# Altium footprint library FootprintsOld.PcbLib: 93 footprints (part 6 of 6)
Each footprint in its own frame and in the unit in brackets; x right, y up, seen from the top. Pads: shape width x height; smd on the part's side, far side on the other; paste and mask are expansions set on the pad; w line width, h text height; cw(c..) or ccw(c..) is an arc to the next point about the centre after c.
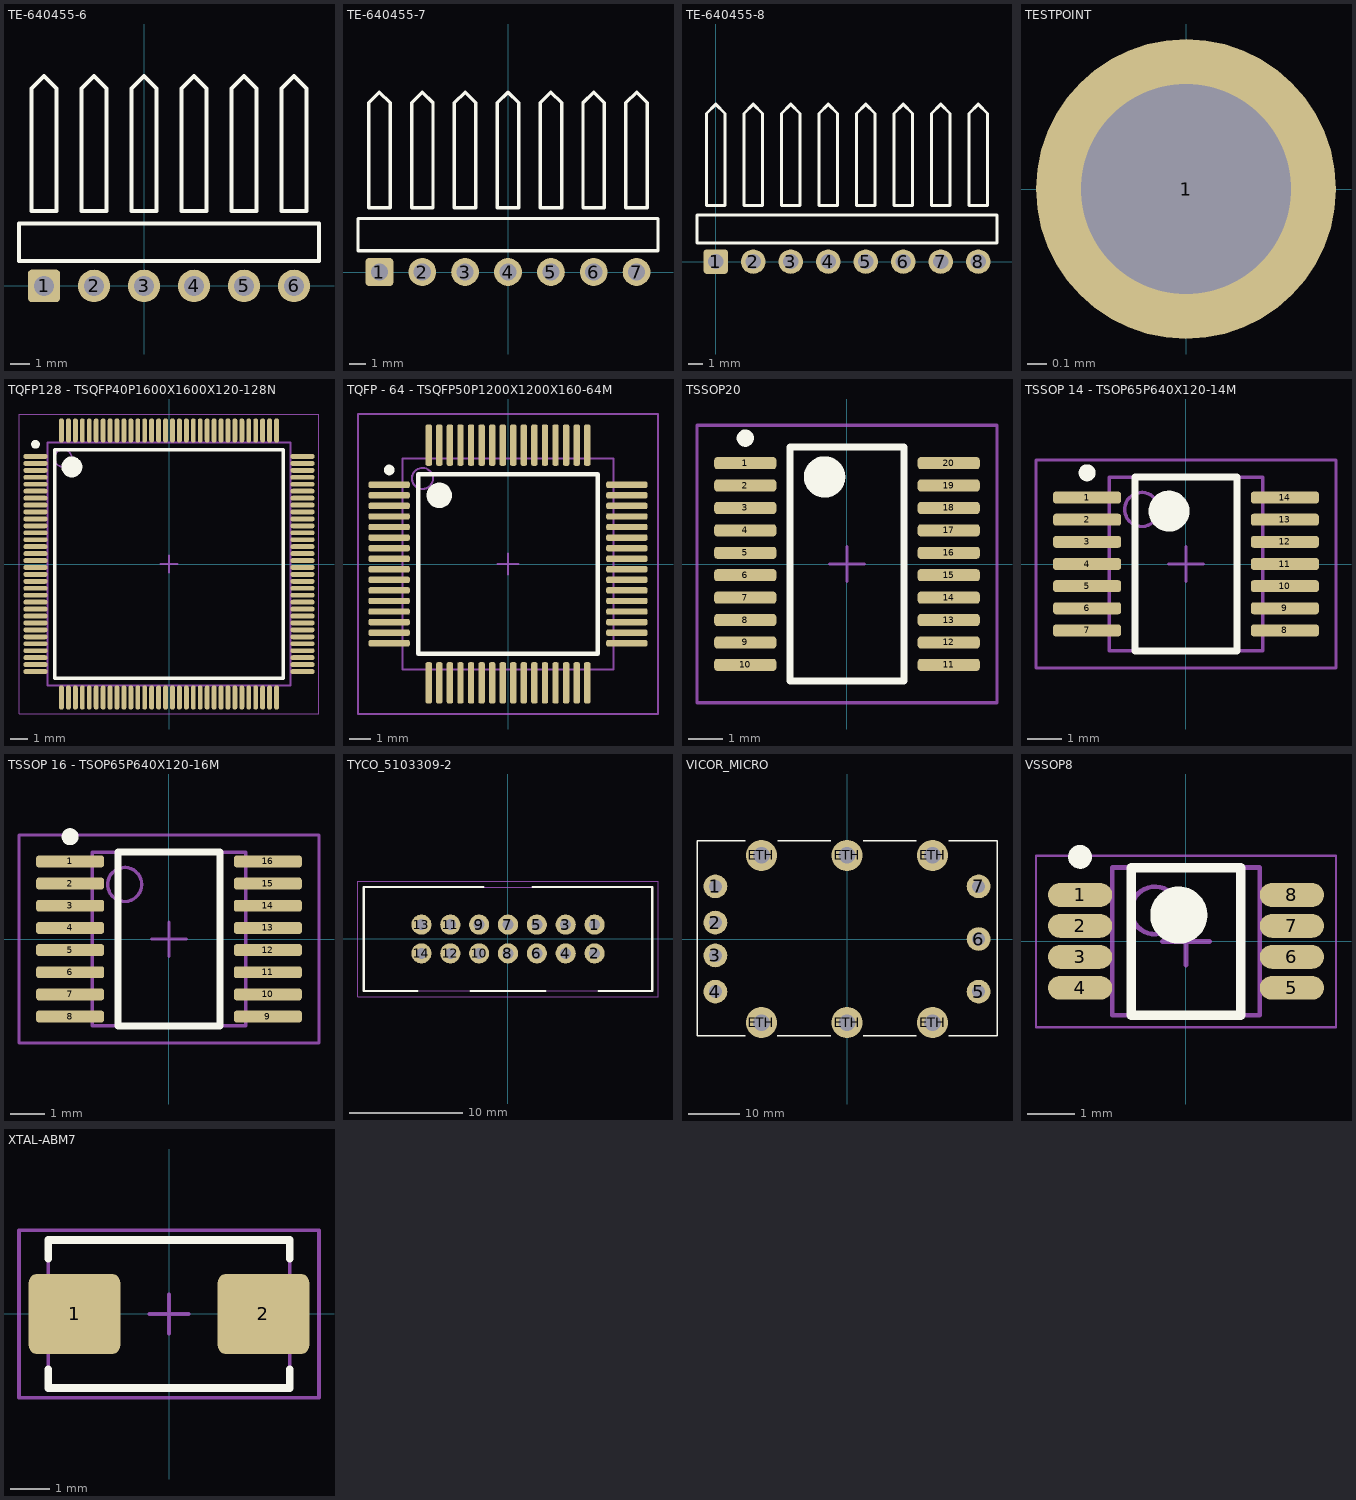
[diagram p5: the footprints below, top view; thin cyan lines are the x and y axes]

## TE-640455-6 [mm] "CONN HEADER RTANG 6POS .100 TIN"
pads (6):
  rrect25% 1.65x1.65 hole 1.02: 1(-5.08,0)
  round 1.65 hole 1.02: 2(-2.54,0) 3(0,0) 4(2.54,0) 5(5.08,0) 6(7.62,0)
Top Overlay:
  lines w0.2: -6.35,1.27 8.89,1.27 8.89,3.175 -6.35,3.175 -6.35,1.27 ; -5.715,3.81 -4.445,3.81 -4.445,10.033 -5.08,10.668 -5.715,10.033 -5.715,3.81 ; -3.175,3.81 -3.175,10.033 -2.54,10.668 -1.905,10.033 -1.905,3.81 -3.175,3.81 ; -0.635,3.81 0.635,3.81 0.635,10.033 0,10.668 -0.635,10.033 -0.635,3.81 ; 1.905,3.81 3.175,3.81 3.175,10.033 2.54,10.668 1.905,10.033 1.905,3.81 ; 4.445,3.81 5.715,3.81 5.715,10.033 5.08,10.668 4.445,10.033 4.445,3.81 ; 6.985,3.81 6.985,10.033 7.62,10.668 8.255,10.033 8.255,3.81 6.985,3.81
3D body "c-640455-6-y-3d.STEP": height 6.49, standoff -3.54, extent -6.35,-0.305 8.89,10.744

## TE-640455-7 [mm] "CONN HEADER RTANG 7POS .100 TIN"
pads (7):
  rrect25% 1.65x1.65 hole 1.02: 1(-7.62,0)
  round 1.65 hole 1.02: 2(-5.08,0) 3(-2.54,0) 4(0,0) 5(2.54,0) 6(5.08,0) 7(7.62,0)
Top Overlay:
  lines w0.2: -8.89,1.27 8.89,1.27 8.89,3.175 -8.89,3.175 -8.89,1.27 ; -8.255,3.81 -6.985,3.81 -6.985,10.033 -7.62,10.668 -8.255,10.033 -8.255,3.81 ; -5.715,3.81 -5.715,10.033 -5.08,10.668 -4.445,10.033 -4.445,3.81 -5.715,3.81 ; -3.175,3.81 -1.905,3.81 -1.905,10.033 -2.54,10.668 -3.175,10.033 -3.175,3.81 ; -0.635,3.81 0.635,3.81 0.635,10.033 0,10.668 -0.635,10.033 -0.635,3.81 ; 1.905,3.81 3.175,3.81 3.175,10.033 2.54,10.668 1.905,10.033 1.905,3.81 ; 4.445,3.81 5.715,3.81 5.715,10.033 5.08,10.668 4.445,10.033 4.445,3.81 ; 6.985,3.81 8.255,3.81 8.255,10.033 7.62,10.668 6.985,10.033 6.985,3.81
3D body "c-640455-7-y-3d.STEP": height 6.49, standoff -3.54, extent -8.89,-0.33 8.89,10.719

## TE-640455-8 [mm] "CONN HEADER RTANG 8POS .100 TIN"
pads (8):
  rrect25% 1.65x1.65 hole 1.02: 1(0,0)
  round 1.65 hole 1.02: 2(2.54,0) 3(5.08,0) 4(7.62,0) 5(10.16,0) 6(12.7,0) 7(15.24,0) 8(17.78,0)
Top Overlay:
  lines w0.2: -1.27,1.27 -1.27,3.175 19.05,3.175 19.05,1.27 -1.27,1.27 ; -0.635,3.81 -0.635,10.033 0,10.668 0.635,10.033 0.635,3.81 -0.635,3.81 ; 1.905,3.81 3.175,3.81 3.175,10.033 2.54,10.668 1.905,10.033 1.905,3.81 ; 4.445,3.81 4.445,10.033 5.08,10.668 5.715,10.033 5.715,3.81 4.445,3.81 ; 6.985,3.81 6.985,10.033 7.62,10.668 8.255,10.033 8.255,3.81 6.985,3.81 ; 9.525,3.81 9.525,10.033 10.16,10.668 10.795,10.033 10.795,3.81 9.525,3.81 ; 12.065,3.81 12.065,10.033 12.7,10.668 13.335,10.033 13.335,3.81 12.065,3.81 ; 14.605,3.81 14.605,10.033 15.24,10.668 15.875,10.033 15.875,3.81 14.605,3.81 ; 17.145,3.81 18.415,3.81 18.415,10.033 17.78,10.668 17.145,10.033 17.145,3.81
3D body "c-640455-7-y-3d.STEP": height 6.49, standoff -3.54, extent -1.27,-0.33 16.51,10.719

## TESTPOINT [mil]
height 300
pads (1):
  round 60 hole 42: 1(0,0)
3D body "KEYSOTONE-5000.STEP": height 179.92, standoff -120.08, extent -50,-50 50,50

## TQFP128 - TSQFP40P1600X1600X120-128N [mm] "TSQFP, 128-Leads, Body 14.00x14.00mm, Pitch 0.40mm, IPC Medium Density"
height 1.2
pads (128):
  oval 1.4x0.28 smd: 1(-7.7,6.2) 2(-7.7,5.8) 3(-7.7,5.4) 4(-7.7,5) 5(-7.7,4.6) 6(-7.7,4.2) 7(-7.7,3.8) 8(-7.7,3.4) 9(-7.7,3) 10(-7.7,2.6) 11(-7.7,2.2) 12(-7.7,1.8) 13(-7.7,1.4) 14(-7.7,1) 15(-7.7,0.6) 16(-7.7,0.2) 17(-7.7,-0.2) 18(-7.7,-0.6) 19(-7.7,-1) 20(-7.7,-1.4) 21(-7.7,-1.8) 22(-7.7,-2.2) 23(-7.7,-2.6) 24(-7.7,-3) 25(-7.7,-3.4) 26(-7.7,-3.8) 27(-7.7,-4.2) 28(-7.7,-4.6) 29(-7.7,-5) 30(-7.7,-5.4) 31(-7.7,-5.8) 32(-7.7,-6.2) 65(7.7,-6.2) 66(7.7,-5.8) 67(7.7,-5.4) 68(7.7,-5) 69(7.7,-4.6) 70(7.7,-4.2) 71(7.7,-3.8) 72(7.7,-3.4) 73(7.7,-3) 74(7.7,-2.6) 75(7.7,-2.2) 76(7.7,-1.8) 77(7.7,-1.4) 78(7.7,-1) 79(7.7,-0.6) 80(7.7,-0.2) 81(7.7,0.2) 82(7.7,0.6) 83(7.7,1) 84(7.7,1.4) 85(7.7,1.8) 86(7.7,2.2) 87(7.7,2.6) 88(7.7,3) 89(7.7,3.4) 90(7.7,3.8) 91(7.7,4.2) 92(7.7,4.6) 93(7.7,5) 94(7.7,5.4) 95(7.7,5.8) 96(7.7,6.2)
  oval 0.28x1.4 smd: 33(-6.2,-7.7) 34(-5.8,-7.7) 35(-5.4,-7.7) 36(-5,-7.7) 37(-4.6,-7.7) 38(-4.2,-7.7) 39(-3.8,-7.7) 40(-3.4,-7.7) 41(-3,-7.7) 42(-2.6,-7.7) 43(-2.2,-7.7) 44(-1.8,-7.7) 45(-1.4,-7.7) 46(-1,-7.7) 47(-0.6,-7.7) 48(-0.2,-7.7) 49(0.2,-7.7) 50(0.6,-7.7) 51(1,-7.7) 52(1.4,-7.7) 53(1.8,-7.7) 54(2.2,-7.7) 55(2.6,-7.7) 56(3,-7.7) 57(3.4,-7.7) 58(3.8,-7.7) 59(4.2,-7.7) 60(4.6,-7.7) 61(5,-7.7) 62(5.4,-7.7) 63(5.8,-7.7) 64(6.2,-7.7) 97(6.2,7.7) 98(5.8,7.7) 99(5.4,7.7) 100(5,7.7) 101(4.6,7.7) 102(4.2,7.7) 103(3.8,7.7) 104(3.4,7.7) 105(3,7.7) 106(2.6,7.7) 107(2.2,7.7) 108(1.8,7.7) 109(1.4,7.7) 110(1,7.7) 111(0.6,7.7) 112(0.2,7.7) 113(-0.2,7.7) 114(-0.6,7.7) 115(-1,7.7) 116(-1.4,7.7) 117(-1.8,7.7) 118(-2.2,7.7) 119(-2.6,7.7) 120(-3,7.7) 121(-3.4,7.7) 122(-3.8,7.7) 123(-4.2,7.7) 124(-4.6,7.7) 125(-5,7.7) 126(-5.4,7.7) 127(-5.8,7.7) 128(-6.2,7.7)
Top Overlay:
  circle w0.25: c-7.7,6.9 r0.125
  circle w0.6: c-5.6,5.6 r0.3
  lines w0.2: -6.6,-6.6 -6.6,6.6 6.6,6.6 6.6,-6.6 -6.6,-6.6
Top Assembly (Mech13):
  circle w0.1: c-6.1,6.1 r0.5
  lines w0.1: -7,-7 -7,7 7,7 7,-7 -7,-7
Top Courtyard:
  lines w0.05: -8.65,-8.65 -8.65,8.65 8.65,8.65 8.65,-8.65 -8.65,-8.65
  lines w0.1: -0.5,0 0.5,0 ; 0,-0.5 0,0.5
3D body "User Library-TQFP128.step": height 1.1, standoff 0, extent -8.009,-8.009 8.009,8.009

## TQFP - 64 - TSQFP50P1200X1200X160-64M [mm] "TSQFP, 64-Leads, Body 12,0x12,0mm (max), Pitch 0,50mm, IPC Low Density"
height 1.6
pads (64):
  rrect50% 1.95x0.3 smd: 1(-5.625,3.75) 2(-5.625,3.25) 3(-5.625,2.75) 4(-5.625,2.25) 5(-5.625,1.75) 6(-5.625,1.25) 7(-5.625,0.75) 8(-5.625,0.25) 9(-5.625,-0.25) 10(-5.625,-0.75) 11(-5.625,-1.25) 12(-5.625,-1.75) 13(-5.625,-2.25) 14(-5.625,-2.75) 15(-5.625,-3.25) 16(-5.625,-3.75) 33(5.625,-3.75) 34(5.625,-3.25) 35(5.625,-2.75) 36(5.625,-2.25) 37(5.625,-1.75) 38(5.625,-1.25) 39(5.625,-0.75) 40(5.625,-0.25) 41(5.625,0.25) 42(5.625,0.75) 43(5.625,1.25) 44(5.625,1.75) 45(5.625,2.25) 46(5.625,2.75) 47(5.625,3.25) 48(5.625,3.75)
  rrect50% 0.3x1.95 smd: 17(-3.75,-5.625) 18(-3.25,-5.625) 19(-2.75,-5.625) 20(-2.25,-5.625) 21(-1.75,-5.625) 22(-1.25,-5.625) 23(-0.75,-5.625) 24(-0.25,-5.625) 25(0.25,-5.625) 26(0.75,-5.625) 27(1.25,-5.625) 28(1.75,-5.625) 29(2.25,-5.625) 30(2.75,-5.625) 31(3.25,-5.625) 32(3.75,-5.625) 49(3.75,5.625) 50(3.25,5.625) 51(2.75,5.625) 52(2.25,5.625) 53(1.75,5.625) 54(1.25,5.625) 55(0.75,5.625) 56(0.25,5.625) 57(-0.25,5.625) 58(-0.75,5.625) 59(-1.25,5.625) 60(-1.75,5.625) 61(-2.25,5.625) 62(-2.75,5.625) 63(-3.25,5.625) 64(-3.75,5.625)
Top Overlay:
  circle w0.6: c-3.25,3.25 r0.3
  circle w0.25: c-5.625,4.45 r0.125
  lines w0.2: -4.25,-4.25 4.25,-4.25 4.25,4.25 -4.25,4.25 -4.25,-4.25
Top Assembly (Mech13):
  circle w0.1: c-4.05,4.05 r0.5
  lines w0.1: -5,-5 5,-5 5,5 -5,5 -5,-5
Top Courtyard:
  lines w0.1: -0.5,0 0.5,0 ; 0,-0.5 0,0.5 ; -7.1,-7.1 7.1,-7.1 7.1,7.1 -7.1,7.1 -7.1,-7.1
3D body "TQFP - 64 - TSQFP50P1200X1200X160-64M.STEP": height 1.7, standoff 0.05, extent -6,-6 6,6

## TSSOP20 [mm] "TSOP, 14-Leads, Body 5.1x4.5mm (max), Pitch 0.65mm, IPC Low Density"
height 1.2
pads (20):
  rrect50% 1.8x0.35 smd: 1(-2.95,2.925) 2(-2.95,2.275) 3(-2.95,1.625) 4(-2.95,0.975) 5(-2.95,0.325) 6(-2.95,-0.325) 7(-2.95,-0.975) 8(-2.95,-1.625) 9(-2.95,-2.275) 10(-2.95,-2.925) 11(2.95,-2.925) 12(2.95,-2.275) 13(2.95,-1.625) 14(2.95,-0.975) 15(2.95,-0.325) 16(2.95,0.325) 17(2.95,0.975) 18(2.95,1.625) 19(2.95,2.275) 20(2.95,2.925)
Top Overlay:
  circle w0.25: c-2.95,3.65 r0.125
  circle w0.6: c-0.65,2.525 r0.3
  lines w0.2: -1.65,-3.388 1.65,-3.388 1.65,3.388 -1.65,3.388 -1.65,-3.388
Top Courtyard:
  lines w0.1: -0.5,0 0.5,0 ; 0,-0.5 0,0.5 ; -4.35,-4.025 4.35,-4.025 4.35,4.025 -4.35,4.025 -4.35,-4.025
3D body "TSSOP20.STEP": height 1.09, standoff 0, extent -3.15,-3.35 3.13,3.15

## TSSOP 14 - TSOP65P640X120-14M [mm] "TSOP, 14-Leads, Body 5,1x4,5mm (max), Pitch 0,65mm, IPC Low Density"
height 1.2
pads (14):
  rrect50% 2x0.35 smd: 1(-2.9,1.95) 2(-2.9,1.3) 3(-2.9,0.65) 4(-2.9,0) 5(-2.9,-0.65) 6(-2.9,-1.3) 7(-2.9,-1.95) 8(2.9,-1.95) 9(2.9,-1.3) 10(2.9,-0.65) 11(2.9,0) 12(2.9,0.65) 13(2.9,1.3) 14(2.9,1.95)
Top Overlay:
  circle w0.25: c-2.9,2.675 r0.125
  circle w0.6: c-0.5,1.55 r0.3
  lines w0.2: -1.5,-2.55 -1.5,2.55 1.5,2.55 1.5,-2.55 -1.5,-2.55
Top Assembly (Mech13):
  circle w0.1: c-1.3,1.6 r0.5
  lines w0.1: -2.25,-2.55 -2.25,2.55 2.25,2.55 2.25,-2.55 -2.25,-2.55
Top Courtyard:
  lines w0.1: -0.5,0 0.5,0 ; 0,-0.5 0,0.5 ; -4.4,-3.05 -4.4,3.05 4.4,3.05 4.4,-3.05 -4.4,-3.05
3D body "TSSOP 14 - TSOP65P640X120-14M.STEP": height 1.35, standoff -0.04, extent -3.206,-2.5 3.206,2.5

## TSSOP 16 - TSOP65P640X120-16M [mm] "TSOP, 16-Leads, Body 5,1x4,5mm (max), Pitch 0,65mm, IPC Low Density"
height 1.2
pads (16):
  rrect50% 2x0.35 smd mask+0.152: 1(-2.9,2.275) 2(-2.9,1.625) 3(-2.9,0.975) 4(-2.9,0.325) 5(-2.9,-0.325) 6(-2.9,-0.975) 7(-2.9,-1.625) 8(-2.9,-2.275) 9(2.9,-2.275) 10(2.9,-1.625) 11(2.9,-0.975) 12(2.9,-0.325) 13(2.9,0.325) 14(2.9,0.975) 15(2.9,1.625) 16(2.9,2.275)
Top Overlay:
  circle w0.25: c-2.9,3 r0.125
  lines w0.2: -1.5,-2.55 1.5,-2.55 1.5,2.55 -1.5,2.55 -1.5,-2.55
Top Assembly (Mech13):
  circle w0.1: c-1.3,1.6 r0.5
  lines w0.1: -2.25,-2.55 2.25,-2.55 2.25,2.55 -2.25,2.55 -2.25,-2.55
Top Courtyard:
  lines w0.1: -0.5,0 0.5,0 ; 0,-0.5 0,0.5 ; -4.4,-3.05 4.4,-3.05 4.4,3.05 -4.4,3.05 -4.4,-3.05
3D body "TSSOP 16 - TSOP65P640X120-16M.STEP": height 1.35, standoff -0.04, extent -3.206,-2.5 3.206,2.5

## TYCO_5103309-2 [mil]
height 217.99
pads (14):
  round 70 hole 38: 1(300,50) 2(300,-50) 3(200,50) 4(200,-50) 5(100,50) 6(100,-50) 7(0,50) 8(0,-50) 9(-100,50) 10(-100,-50) 11(-200,50) 12(-200,-50) 13(-300,50) 14(-300,-50)
Top Overlay:
  lines w7.87: -315,-180 -500,-180 -500,0 -500,180 -85,180 ; -130,-180 0,-180 130,-180 ; 85,180 500,180 500,0 500,-180 315,-180
Top Assembly (Mech13):
  lines w3.94: -500,-180 -500,180 500,180 500,-180 -500,-180
Top Courtyard:
  lines w3.94: -520,-200 520,-200 520,200 -520,200 -520,-200
3D body "C-5103309-02-3.STEP": height 388.98, standoff -119.02, extent -500,-180 500,180

## VICOR_MICRO [mil]
pads (13):
  round 180 hole 100: 1(-1000,400) 2(-1000,125) 3(-1000,-125) 4(-1000,-400) 5(1000,-400) 6(1000,0) 7(1000,400)
  round 236.22 hole 125.98: ETH(-650,-635) ETH(-650,635) ETH(0,-635) ETH(0,635) ETH(650,-635) ETH(650,635)
Top Overlay:
  lines w10: -775,-735 -1140,-735 -1140,745 -775,745 ; -530,-735 -125,-735 ; -525,745 -125,745 ; 125,-735 525,-735 ; 125,745 525,745 ; 775,-735 1140,-735 1140,745 775,745
3D body "VicorMicro.STEP": height 925.84, standoff -105.84, extent -1140,-735.98 1140,745.98

## VSSOP8 [mm] "TSOP, 8-Leads, Body 3.00x3.00mm, Pitch 0.65mm, IPC Medium Density"
height 1.1
pads (8):
  oval 1.35x0.5 smd: 1(-2.225,0.975) 2(-2.225,0.325) 3(-2.225,-0.325) 4(-2.225,-0.975) 5(2.225,-0.975) 6(2.225,-0.325) 7(2.225,0.325) 8(2.225,0.975)
Top Overlay:
  circle w0.6: c-0.15,0.55 r0.3
  circle w0.25: c-2.225,1.775 r0.125
  lines w0.2: -1.15,-1.55 1.15,-1.55 1.15,1.55 -1.15,1.55 -1.15,-1.55
Top Assembly:
  circle w0.1: c-0.65,0.65 r0.5
  lines w0.1: -1.55,-1.55 1.55,-1.55 1.55,1.55 -1.55,1.55 -1.55,-1.55
Courtyard Top (Mech10):
  lines w0.05: -3.15,-1.8 3.15,-1.8 3.15,1.8 -3.15,1.8 -3.15,-1.8
  lines w0.1: -0.5,0 0.5,0 ; 0,-0.5 0,0.5
3D body "VSSOP8.step": height 1.1, standoff 0, extent -2.45,-1.55 2.45,1.55

## XTAL-ABM7 [mm] "2-Leads, Body 6.0x3.5mm, IPC Medium Density"
height 1.4
pads (2):
  rrect20% 2.35x2.05 smd: 1(-2.425,0) 2(2.425,0)
Top Overlay:
  lines w0.2: -3.1,-1.425 -3.1,-1.9 3.1,-1.9 3.1,-1.425 ; -3.1,1.425 -3.1,1.9 3.1,1.9 3.1,1.425
Top Assembly (Mech13):
  lines w0.1: -3.1,-1.85 3.1,-1.85 3.1,1.85 -3.1,1.85 -3.1,-1.85
Top Courtyard:
  lines w0.1: -0.5,0 0.5,0 ; 0,-0.5 0,0.5 ; -3.85,-2.15 3.85,-2.15 3.85,2.15 -3.85,2.15 -3.85,-2.15
3D body "XTALl-ABM7.STEP": height 1.44, standoff 0.04, extent -3.099,-1.85 3.101,1.85